# Altium footprint library sun_library.PcbLib: 412 footprints (part 18 of 26)
Each footprint in its own frame and in the unit in brackets; x right, y up, seen from the top. Pads: shape width x height; smd on the part's side, far side on the other; paste and mask are expansions set on the pad; w line width, h text height; cw(c..) or ccw(c..) is an arc to the next point about the centre after c.
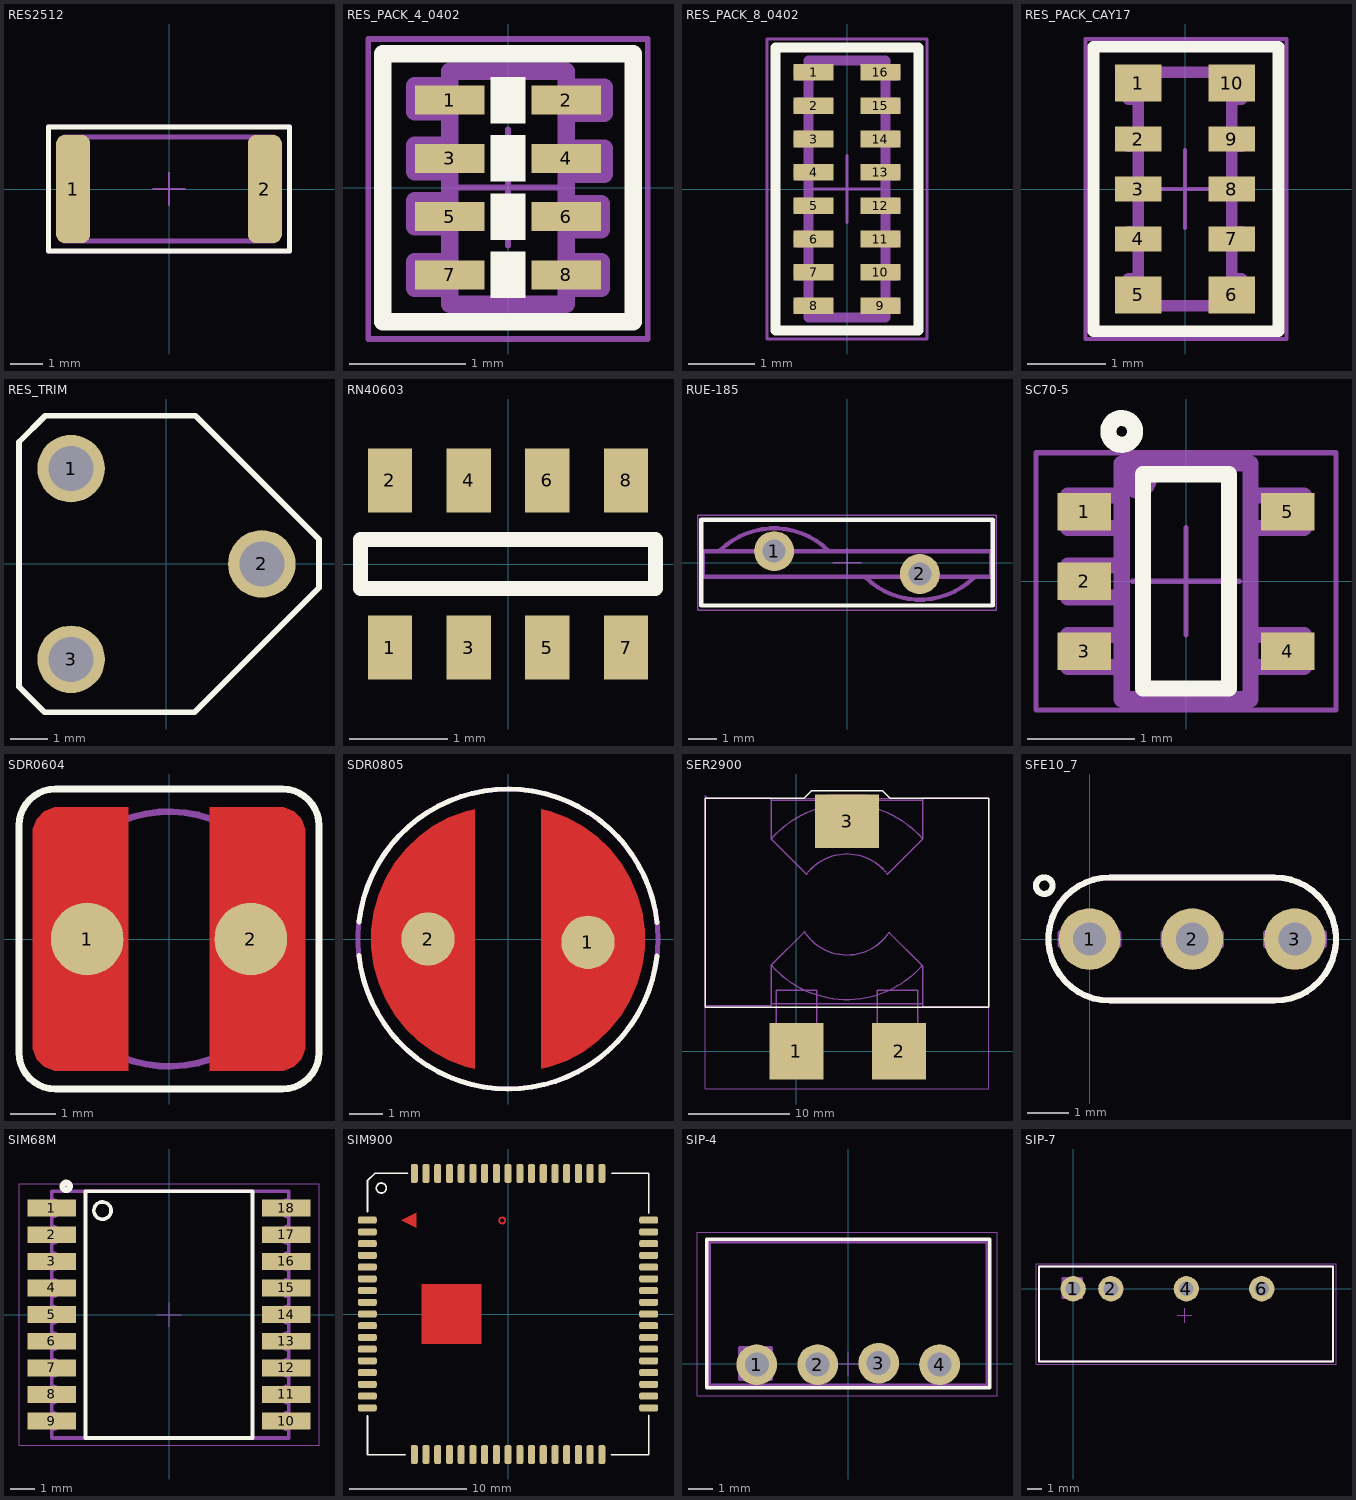
[diagram p17: the footprints below, top view; thin cyan lines are the x and y axes]

## RES2512 [mm] "Chip Resistor; Body 6.3 x 3.1 mm (LxW typ)"
height 0.55
pads (2):
  rrect50% 1.04x3.32 smd: 1(-2.94,0) 2(2.94,0)
Top Overlay:
  lines w0.15: -3.7,-1.9 3.7,-1.9 3.7,1.9 -3.7,1.9 -3.7,-1.9
TopAssy 13:
  lines w0.15: -3.2,-1.6 3.2,-1.6 3.2,1.6 -3.2,1.6 -3.2,-1.6
CourtTop 15:
  lines w0.05: -0.5,0 0.5,0 ; 0,-0.5 0,0.5 ; -3.75,-1.95 3.75,-1.95 3.75,1.95 -3.75,1.95 -3.75,-1.95
3D body "User Library-SMD RESISTOR-2512.step": height 0.6, standoff 0, extent -3.2,-1.6 3.2,1.6

## RES_PACK_4_0402 [mm]
pads (8):
  rect 0.6x0.25 smd mask+0.075: 1(-0.5,0.75) 2(0.5,0.75) 3(-0.5,0.25) 4(0.5,0.25) 5(-0.5,-0.25) 6(0.5,-0.25) 7(-0.5,-0.75) 8(0.5,-0.75)
Top Overlay:
  rectangle: -0.15,0.55 0.15,0.95
  rectangle: -0.15,0.05 0.15,0.45
  rectangle: -0.15,-0.45 0.15,-0.05
  rectangle: -0.15,-0.95 0.15,-0.55
  lines w0.15: -1.075,-1.15 -1.075,1.15 1.075,1.15 1.075,-1.15 -1.075,-1.15
TopAssy 13:
  lines w0.15: -0.525,-0.638 -0.8,-0.638 -0.8,-0.863 -0.5,-0.863 ; -0.525,-0.113 -0.8,-0.113 -0.8,-0.337 -0.5,-0.337 ; -0.525,0.362 -0.8,0.362 -0.8,0.138 -0.5,0.138 ; -0.5,0.65 -0.8,0.65 -0.8,0.875 -0.525,0.875 -0.5,0.85 ; 0.5,-0.638 0.8,-0.638 0.8,-0.863 0.525,-0.863 ; 0.5,-0.138 0.8,-0.138 0.8,-0.362 0.525,-0.362 ; 0.525,0.337 0.825,0.337 0.825,0.113 0.55,0.113 ; 0.525,0.863 0.825,0.863 0.825,0.638 0.55,0.638 ; -0.5,-1 0.5,-1 0.5,1 -0.5,1 -0.5,-1
CourtTop 15:
  lines w0.05: -0.5,0 0.5,0 ; 0,-0.5 0,0.5 ; -1.2,-1.3 -1.2,1.275 1.2,1.275 1.2,-1.3 -1.2,-1.3
3D body "User Library-YC124-1.step": height 0.45, standoff 0, extent -0.5,-1 0.5,1

## RES_PACK_8_0402 [mm]
pads (16):
  rect 0.6x0.25 smd mask+0.075: 1(-0.5,1.75) 2(-0.5,1.25) 3(-0.5,0.75) 4(-0.5,0.25) 5(-0.5,-0.25) 6(-0.5,-0.75) 7(-0.5,-1.25) 8(-0.5,-1.75) 9(0.5,-1.75) 10(0.5,-1.25) 11(0.5,-0.75) 12(0.5,-0.25) 13(0.5,0.25) 14(0.5,0.75) 15(0.5,1.25) 16(0.5,1.75)
Top Overlay:
  lines w0.15: -1.075,-2.125 1.075,-2.125 1.075,2.125 -1.075,2.125 -1.075,-2.125
TopAssy 13:
  lines w0.15: -0.575,-1.8 -0.725,-1.8 -0.725,-1.7 -0.575,-1.7 ; -0.575,-1.3 -0.725,-1.3 -0.725,-1.2 -0.575,-1.2 ; -0.575,-0.8 -0.725,-0.8 -0.725,-0.7 -0.575,-0.7 ; -0.575,-0.3 -0.725,-0.3 -0.725,-0.2 -0.575,-0.2 ; -0.575,0.2 -0.725,0.2 -0.725,0.3 -0.575,0.3 ; -0.575,0.7 -0.725,0.7 -0.725,0.8 -0.575,0.8 ; -0.575,1.2 -0.725,1.2 -0.725,1.3 -0.575,1.3 ; -0.575,1.7 -0.725,1.7 -0.725,1.8 -0.575,1.8 ; 0.575,-1.8 0.725,-1.8 0.725,-1.7 0.575,-1.7 ; 0.575,-1.3 0.725,-1.3 0.725,-1.2 0.575,-1.2 ; 0.575,-0.8 0.725,-0.8 0.725,-0.7 0.575,-0.7 ; 0.575,-0.3 0.725,-0.3 0.725,-0.2 0.575,-0.2 ; 0.575,0.2 0.725,0.2 0.725,0.3 0.575,0.3 ; 0.575,0.7 0.725,0.7 0.725,0.8 0.575,0.8 ; 0.575,1.2 0.725,1.2 0.725,1.3 0.575,1.3 ; 0.575,1.7 0.725,1.7 0.725,1.8 0.575,1.8 ; -0.575,-1.925 -0.575,1.925 0.575,1.925 0.575,-1.925 -0.575,-1.925
CourtTop 15:
  lines w0.05: -0.5,0 0.5,0 ; 0,-0.5 0,0.5 ; -1.2,-2.25 1.2,-2.25 1.2,2.25 -1.2,2.25 -1.2,-2.25
3D body "User Library-YC248-1.step": height 0.45, standoff 0, extent -0.8,-2 0.8,2

## RES_PACK_CAY17 [mm] "RES_PACK_CAY17 Bourns"
pads (10):
  rect 0.6x0.48 smd mask+0.075: 1(-0.6,1.36) 5(-0.6,-1.36) 6(0.6,-1.36) 10(0.6,1.36)
  rect 0.6x0.32 smd mask+0.075: 2(-0.6,0.64) 3(-0.6,0) 4(-0.6,-0.64) 7(0.6,-0.64) 8(0.6,0) 9(0.6,0.64)
Top Overlay:
  lines w0.15: -1.175,-1.825 -1.175,1.825 1.2,1.825 1.2,-1.825 -1.175,-1.825
TopAssy 13:
  lines w0.15: -0.6,-1.25 -0.725,-1.25 -0.725,-1.15 -0.6,-1.15 ; -0.6,-0.65 -0.725,-0.65 -0.725,-0.55 -0.6,-0.55 ; -0.6,-0.05 -0.725,-0.05 -0.725,0.05 -0.6,0.05 ; -0.6,0.55 -0.725,0.55 -0.725,0.65 -0.6,0.65 ; -0.6,1.15 -0.725,1.15 -0.725,1.25 -0.6,1.25 ; 0.6,-1.25 0.725,-1.25 0.725,-1.15 0.6,-1.15 ; 0.6,-0.65 0.725,-0.65 0.725,-0.55 0.6,-0.55 ; 0.6,-0.05 0.725,-0.05 0.725,0.05 0.6,0.05 ; 0.6,0.55 0.725,0.55 0.725,0.65 0.6,0.65 ; 0.6,1.15 0.725,1.15 0.725,1.25 0.6,1.25 ; -0.6,-1.5 0.6,-1.5 0.6,1.5 -0.6,1.5 -0.6,-1.5
CourtTop 15:
  lines w0.05: -0.5,0 0.5,0 ; 0,-0.5 0,0.5 ; -1.275,-1.925 -1.275,1.925 1.3,1.925 1.3,-1.925 -1.275,-1.925
3D body "User Library-cay17.step": height 0.49, standoff -0.01, extent -0.8,-1.6 0.8,1.6

## RES_TRIM [mm]
height 5
pads (3):
  round 1.8 hole 1.2: 1(-2.54,2.54) 2(2.54,0) 3(-2.54,-2.54)
Top Overlay:
  lines w0.15: -3.927,-3.273 -3.248,-3.952 0.747,-3.952 4.064,-0.635 4.064,0 4.064,0.657 1.292,3.429 0.773,3.948 -3.227,3.948 -3.927,3.248 -3.927,-3.273
3D body "User Library-Trimmer, 3306F-1.STEP": height 7.62, standoff -3.04, extent -4.852,-3.305 3.4,3.505

## RN40603 [mm]
pads (8):
  rect 0.45x0.65 smd: 1(-1.2,-0.85) 2(-1.2,0.85) 3(-0.4,-0.85) 4(-0.4,0.85) 5(0.4,-0.85) 6(0.4,0.85) 7(1.2,-0.85) 8(1.2,0.85)
Top Overlay:
  lines w0.15: -1.5,-0.25 1.5,-0.25 1.5,0.25 -1.5,0.25 -1.5,-0.25
3D body "User Library-Array-1206-4Way-Var2-1.STEP": height 0.5, standoff 0, extent -1.6,-0.8 1.6,0.8

## RUE-185 [mm]
height 11.4
pads (2):
  round 1.4 hole 0.8: 1(-2.55,0.4) 2(2.55,-0.4)
Top Overlay:
  lines w0.15: -5.1,-1.5 5.1,-1.5 5.1,1.5 -5.1,1.5 -5.1,-1.5
TopAssy 13:
  lines w0.15: -4.459,0.409 cw(c-2.55,-1.5) -0.641,0.409 ; 0.641,-0.509 ccw(c2.55,1.4) 4.459,-0.509 ; -5.05,-0.5 5.05,-0.5 5.05,0.4 -5.05,0.4 -5.05,-0.5
CourtTop 15:
  lines w0.05: -0.5,0 0.5,0 ; 0,-0.5 0,0.5 ; -5.225,-1.675 5.225,-1.675 5.225,1.65 -5.225,1.65 -5.225,-1.675
3D body "RUE185.STEP": height 15.54, standoff -2.69, extent -5.097,-1.6 5.103,1.5

## SC70-5 [mm]
pads (5):
  rect 0.5x0.35 smd mask+0.075: 1(-0.95,0.65) 2(-0.95,0) 3(-0.95,-0.65) 4(0.95,-0.65) 5(0.95,0.65)
Top Overlay:
  circle w0.15: c-0.6,1.4 r0.125
  lines w0.15: -0.4,-1 -0.4,1 0.4,1 0.4,-1 -0.4,-1
TopAssy 13:
  circle w0.15: c-0.45,0.95 r0.1
  lines w0.15: -0.6,-0.8 -1.1,-0.8 -1.1,-0.5 -0.6,-0.5 ; -0.6,-0.15 -1.1,-0.15 -1.1,0.15 -0.6,0.15 ; -0.6,0.5 -1.1,0.5 -1.1,0.8 -0.6,0.8 ; 0.6,-0.8 1.1,-0.8 1.1,-0.5 0.6,-0.5 ; 0.6,0.5 1.1,0.5 1.1,0.8 0.6,0.8 ; -0.6,-1.1 -0.6,1.1 0.6,1.1 0.6,-1.1 -0.6,-1.1
CourtTop 15:
  lines w0.05: -0.5,0 0.5,0 ; 0,-0.5 0,0.5 ; -1.4,-1.2 -1.4,1.2 1.4,1.2 1.4,-1.2 -1.4,-1.2
3D body "User Library-SC70-5-1.step": height 0.95, standoff 0, extent -1.025,-1 1.075,1

## SDR0604 [mm] "SDR0604, SMD Power Inductors"
height 5
pads (2):
  round 1.6 smd: 1(-1.8,0) 2(1.8,0)
Top:
  region: -2.4,-2.9 -2.519,-2.9 -2.74,-2.809 -2.909,-2.64 -3,-2.42 -3,-2.3 -3,2.3 -3,2.419 -2.909,2.64 -2.74,2.809 -2.519,2.9 -2.4,2.9 -0.9,2.9 -0.9,-2.9
  region: 2.4,2.9 2.519,2.9 2.74,2.809 2.909,2.64 3,2.42 3,2.3 3,-2.3 3,-2.419 2.909,-2.64 2.74,-2.809 2.519,-2.9 2.4,-2.9 0.9,-2.9 0.9,2.9
Top Overlay:
  lines w0.15: -3.3,-2.5 ccw(c-2.5,-2.5) -2.5,-3.3 2.5,-3.3 ccw(c2.5,-2.5) 3.3,-2.5 3.3,2.5 ccw(c2.5,2.5) 2.5,3.3 -2.5,3.3 ccw(c-2.5,2.5) -3.3,2.5 -3.3,-2.5
TopAssy 13:
  circle w0.15: c0,0 r2.802
3D body "User Library-SDR0604.step": height 4.55, standoff 0, extent -2.754,-2.8 2.754,2.8

## SDR0805 [mm] "SDR0805, SCD0705 SMD Power Inductors"
height 5
pads (2):
  round 1.6 smd: 1(2.4,-0.1) 2(-2.4,0)
Top:
  region: 0.997,-3.9 0.997,3.9 1.006,3.896 1.268,3.835 1.771,3.643 2.243,3.386 2.677,3.068 3.065,2.695 3.399,2.273 3.674,1.811 3.884,1.315 4.026,0.797 4.097,0.263 4.097,-0.275 4.024,-0.808 3.881,-1.326 3.669,-1.821 3.393,-2.283 3.058,-2.704 2.67,-3.076 2.235,-3.393 1.762,-3.649 1.259,-3.839
  region: -0.997,3.9 -0.997,-3.9 -1.006,-3.896 -1.268,-3.835 -1.771,-3.643 -2.243,-3.386 -2.677,-3.068 -3.065,-2.695 -3.399,-2.273 -3.673,-1.811 -3.884,-1.316 -4.026,-0.797 -4.097,-0.263 -4.096,0.275 -4.024,0.808 -3.88,1.326 -3.669,1.821 -3.393,2.283 -3.058,2.704 -2.67,3.076 -2.235,3.393 -1.762,3.649 -1.259,3.839
Top Overlay:
  lines w0.15: -4.472,-0.497 ccw(c0,0) 4.47,-0.516 ; -4.47,0.516 cw(c0,0) 4.472,0.497
TopAssy 13:
  circle w0.15: c0,0 r4.5
3D body "User Library-SDR0805.step": height 5.05, standoff 0, extent -3.677,-3.75 3.677,3.75

## SER2900 [mm]
height 17.8
pads (3):
  rect 5.33x5.59 smd: 1(0,0) 2(10.15,0)
  rect 6.35x5.28 smd: 3(5,22.75)
Top Overlay:
  lines w0.15: 0,4.318 19,4.318 19,25 9.25,25 8.5,25.75 1.5,25.75 0.75,25 -9,25 -9,4.318 0.254,4.318
TopAssy 13:
  lines w0.15: -2.5,24.8 12.485,24.8 ; -2.485,4.7 12.485,4.7 ; -2.485,8.513 -2.485,4.5 -9,4.5 -9,25 -2.485,25 -2.485,20.987 ; -2.485,8.515 0.793,11.793 ; -2.478,8.506 ccw(c5,15) 12.436,8.458 ; 0.802,11.784 ccw(c5,14.5) 9.16,11.726 ; 9.167,11.733 12.485,8.415 ; 12.485,8.413 12.485,4.4 19,4.4 19,25 12.485,25 12.485,20.987 ccw(c5,14.5) -2.485,20.987 ; 12.485,20.985 9,17.5 ccw(c5,14.5) 1,17.5 -2.485,20.985 -2.485,20.987 ; -2,-2 -2,6 2,6 2,-2 -2,-2 ; 3,21 7,21 7,25.3 3,25.3 3,21 ; 8,-2 12,-2 12,6 8,6 8,-2
CourtTop 15:
  lines w0.05: -9,-3.75 -9,25.25 -8.75,25 19,25 19,-3.75 -9,-3.75
3D body "Coilcraft-SER2918H.step": height 17.72, standoff -0.06, extent -8.951,-2.051 18.951,25.89

## SFE10_7 [mm]
pads (3):
  round 1.5 hole 0.8: 1(0,0) 2(2.5,0) 3(5,0)
Top Overlay:
  circle w0.15: c-1.102,1.3 r0.202
  lines w0.15: 0.5,-1.5 cw(c0.5,0) 0.5,1.5 4.5,1.5 cw(c4.5,0) 4.5,-1.5 0.5,-1.5
TopAssy 13:
  lines w0.15: -0.7,-0.15 -0.7,0.15 0.7,0.15 0.7,-0.15 -0.7,-0.15 ; -0.25,-0.15 -0.25,0.15 0.25,0.15 0.25,-0.15 -0.25,-0.15 ; 0.5,-1.5 cw(c0.5,0) 0.5,1.5 4.5,1.5 cw(c4.5,0) 4.5,-1.5 0.5,-1.5 ; 1.8,-0.15 1.8,0.15 3.2,0.15 3.2,-0.15 1.8,-0.15 ; 2.25,-0.15 2.25,0.15 2.75,0.15 2.75,-0.15 2.25,-0.15 ; 4.3,-0.15 4.3,0.15 5.7,0.15 5.7,-0.15 4.3,-0.15 ; 4.75,-0.15 4.75,0.15 5.25,0.15 5.25,-0.15 4.75,-0.15

## SIM68M [mm] "GLONASS/GPS SIM68M"
height 3.2
pads (18):
  rect 2x0.7 smd: 1(-4.85,4.4) 2(-4.85,3.3) 3(-4.85,2.2) 4(-4.85,1.1) 5(-4.85,0) 6(-4.85,-1.1) 7(-4.85,-2.2) 8(-4.85,-3.3) 9(-4.85,-4.4) 10(4.85,-4.4) 11(4.85,-3.3) 12(4.85,-2.2) 13(4.85,-1.1) 14(4.85,0) 15(4.85,1.1) 16(4.85,2.2) 17(4.85,3.3) 18(4.85,4.4)
Top Overlay:
  circle w0.15: c-2.75,4.3 r0.355
  circle w0.254: c-4.25,5.3 r0.15
  lines w0.15: -3.45,-5.1 3.45,-5.1 3.45,5.1 -3.45,5.1 -3.45,-5.1
TopAssy 13:
  lines w0.15: -4.85,-5.1 4.95,-5.1 4.95,-4.75 cw(c4.95,-4.4) 4.95,-4.05 4.95,-3.65 cw(c4.95,-3.3) 4.95,-2.95 4.95,-2.55 cw(c4.95,-2.2) 4.95,-1.85 4.95,-1.45 cw(c4.95,-1.1) 4.95,-0.75 4.95,-0.35 cw(c4.95,0) 4.95,0.35 4.95,0.75 cw(c4.95,1.1) 4.95,1.45 4.95,1.85 cw(c4.95,2.2) 4.95,2.55 4.95,2.95 cw(c4.95,3.3) 4.95,3.65 4.95,4.05 cw(c4.95,4.4) 4.95,4.75 4.95,5.1 -4.85,5.1 -4.85,4.75 cw(c-4.85,4.4) -4.85,4.05 -4.85,3.65 cw(c-4.85,3.3) -4.85,2.95 -4.85,2.55 cw(c-4.85,2.2) -4.85,1.85 -4.85,1.45 cw(c-4.85,1.1) -4.85,0.75 -4.85,0.35 cw(c-4.85,0) -4.85,-0.35 -4.85,-0.75 cw(c-4.85,-1.1) -4.85,-1.45 -4.85,-1.85 cw(c-4.85,-2.2) -4.85,-2.55 -4.85,-2.95 cw(c-4.85,-3.3) -4.85,-3.65 -4.85,-4.05 cw(c-4.85,-4.4) -4.85,-4.75 -4.85,-5.1
CourtTop 15:
  lines w0.05: -0.5,0 0.5,0 ; 0,-0.5 0,0.5 ; -6.2,-5.4 -6.2,5.4 6.2,5.4 6.2,-5.4 -6.2,-5.4
3D body "User Library-SIM68M.step": height 2.56, standoff -0.01, extent -4.81,-5.05 4.91,5.05

## SIM900 [mm]
pads (68):
  rrect50% 1.6x0.6 smd: 1(-12,8) 2(-12,7) 3(-12,6) 4(-12,5) 5(-12,4) 6(-12,3) 7(-12,2) 8(-12,1) 9(-12,0) 10(-12,-1) 11(-12,-2) 12(-12,-3) 13(-12,-4) 14(-12,-5) 15(-12,-6) 16(-12,-7) 17(-12,-8) 35(11.989,-8) 36(11.989,-7) 37(11.989,-6) 38(11.989,-5) 39(11.989,-4) 40(11.989,-3) 41(11.989,-2) 42(11.989,-1) 43(11.989,0) 44(11.989,1) 45(11.989,2) 46(11.989,3) 47(11.989,4) 48(11.989,5) 49(11.989,6) 50(11.989,7) 51(11.989,8)
  rrect50% 0.6x1.6 smd: 18(-8,-11.989) 19(-7,-11.989) 20(-6,-11.989) 21(-5,-11.989) 22(-4,-11.989) 23(-3,-11.989) 24(-2,-11.989) 25(-1,-11.989) 26(0,-11.989) 27(1,-11.989) 28(2,-11.989) 29(3,-11.989) 30(4,-11.989) 31(5,-11.989) 32(6,-11.989) 33(7,-11.989) 34(8,-11.989) 52(8,11.989) 53(7,11.989) 54(6,11.989) 55(5,11.989) 56(4,11.989) 57(3,11.989) 58(2,11.989) 59(1,11.989) 60(0,11.989) 61(-1,11.989) 62(-2,11.989) 63(-3,11.989) 64(-4,11.989) 65(-5,11.989) 66(-6,11.989) 67(-7,11.989) 68(-8,11.989)
Top:
  circle w0.15: c-0.5,7.976 r0.254
  rectangle: -7.366,-2.54 -2.286,2.54
  region: -9.119,8.001 -7.849,7.366 -7.849,8.636
Top Overlay:
  circle w0.15: c-10.814,10.744 r0.426
  lines w0.15: -12,-8.687 -12,-12 -8.763,-12 ; -12,8.712 -12,11.354 -11.354,12 -8.56,12 ; 8.814,-12 12,-12 12,-8.661 ; 8.839,12 12,12 12,8.611
3D body "User Library-SIM900.step": height 3.02, standoff 0, extent -12,-12 12,12

## SIP-4 [mm] "DC-DC конвертер"
height 10.16
pads (4):
  round 1.7 hole 1: 1(-3.81,-0.03) 2(-1.27,-0.03) 3(1.27,0.03) 4(3.81,-0.03)
Top Overlay:
  lines w0.15: -5.9,-1 5.9,-1 5.9,5.2 -5.9,5.2 -5.9,-1
TopAssy 13:
  lines w0.15: -5.8,-0.9 -5.8,5.1 5.8,5.1 5.8,-0.9 -5.8,-0.9 ; -4.51,-0.63 -3.21,-0.63 -3.21,0.67 -4.51,0.67 -4.51,-0.63
CourtTop 15:
  lines w0.05: -0.5,0 0.5,0 ; 0,-0.5 0,0.5 ; -6.3,-1.32 6.2,-1.32 6.2,5.48 -6.3,5.48 -6.3,-1.32
3D body "User Library-B0505S.step": height 10.01, standoff -3.99, extent -5.805,-1 5.8,5.1

## SIP-7 [mm] "DC-DC конвертер"
height 7.05
pads (4):
  round 1.7 hole 1: 1(0,0) 2(2.54,0) 4(7.62,0) 6(12.7,0)
Top Overlay:
  lines w0.15: -2.305,-4.9 -2.305,1.5 17.5,1.5 17.5,-4.9 -2.305,-4.9
TopAssy 13:
  lines w0.15: -2.305,-4.9 17.5,-4.9 17.5,1.5 -2.305,1.5 -2.305,-4.9 ; -0.7,-0.6 0.6,-0.6 0.6,0.7 -0.7,0.7 -0.7,-0.6
CourtTop 15:
  lines w0.05: 7,-1.8 8,-1.8 ; 7.5,-2.3 7.5,-1.3 ; -2.5,-5.1 -2.5,1.7 17.7,1.7 17.7,-5.1 -2.5,-5.1
3D body "User Library-AM1D-0505S.step": height 10, standoff -3.05, extent -2.15,-4.7 17.35,1.31